# Altium footprint library MCU.PcbLib: 87 footprints (part 2 of 6)
Each footprint in its own frame and in the unit in brackets; x right, y up, seen from the top. Pads: shape width x height; smd on the part's side, far side on the other; paste and mask are expansions set on the pad; w line width, h text height; cw(c..) or ccw(c..) is an arc to the next point about the centre after c.
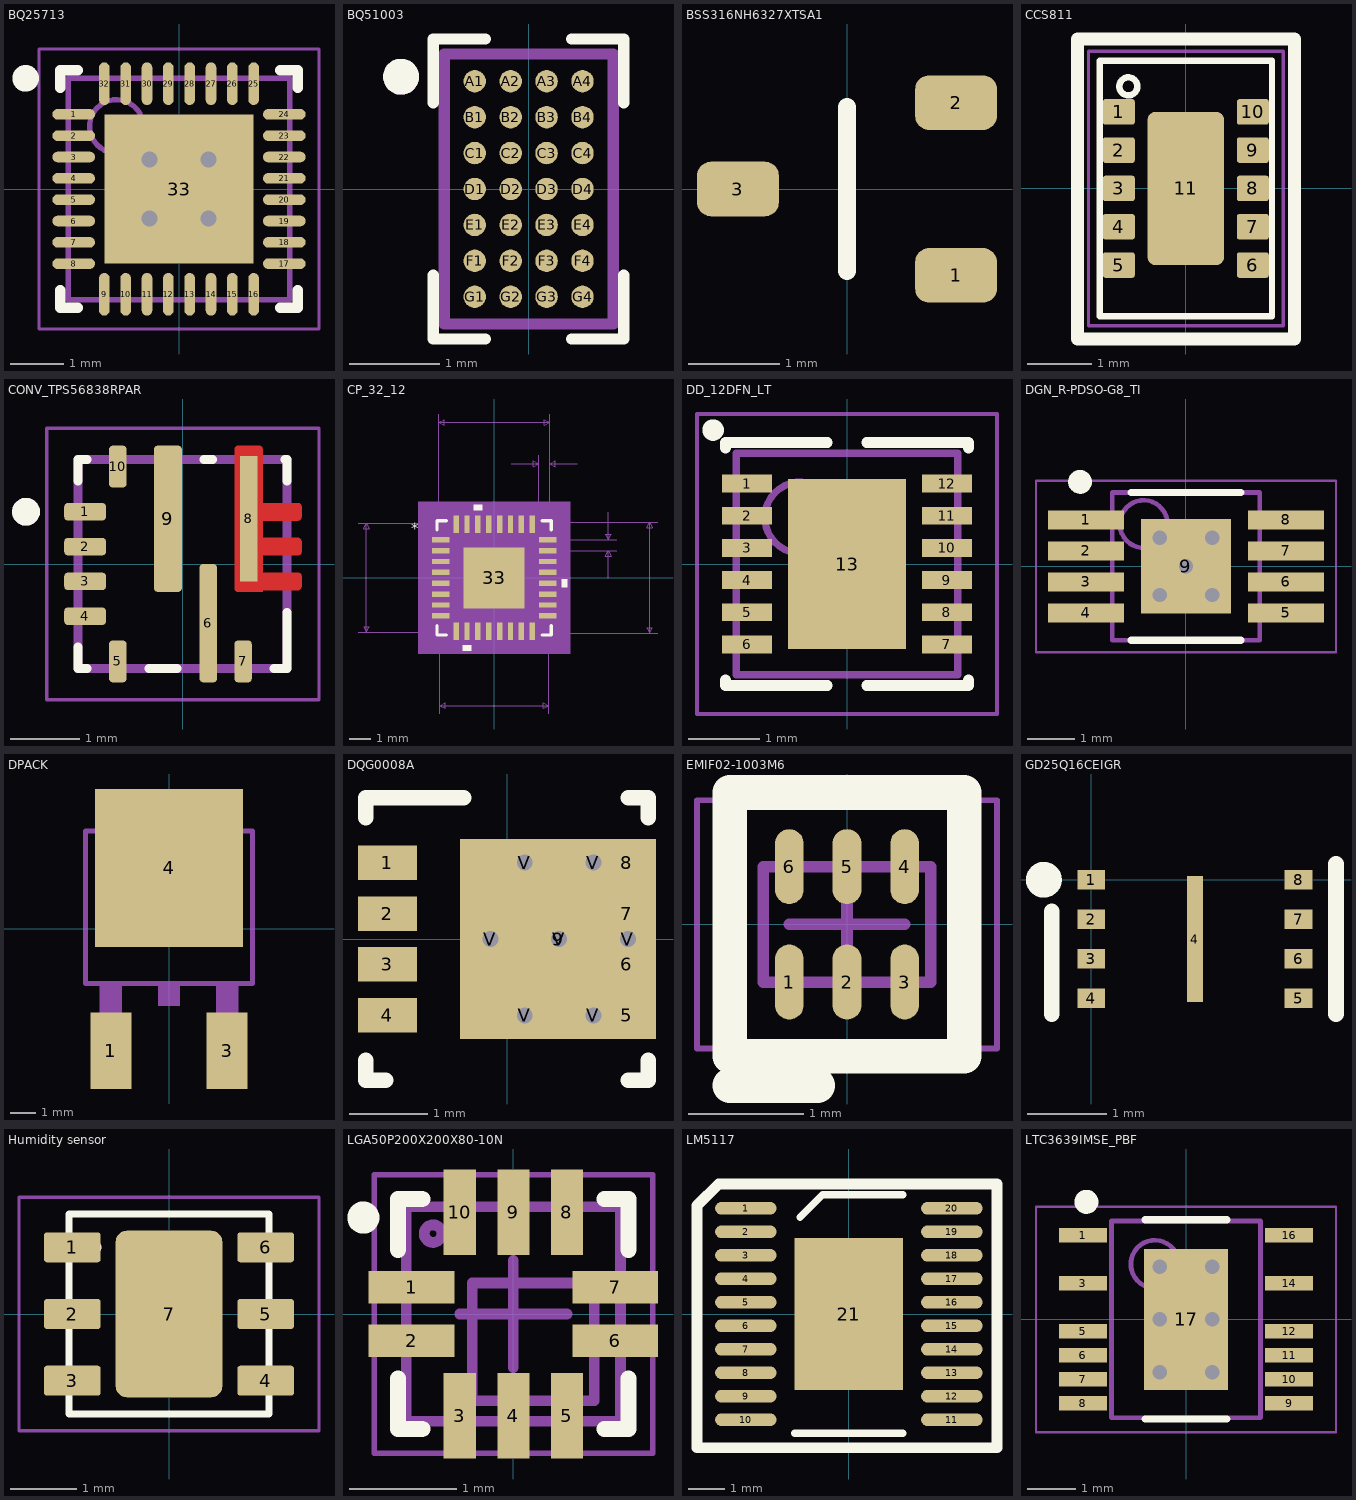
[diagram p1: the footprints below, top view; thin cyan lines are the x and y axes]

## BQ25713 [mm] "LI-ION battery charger USBC"
height 0.8
pads (33):
  oval 0.8x0.2 smd: 1(-1.975,1.4) 2(-1.975,1) 3(-1.975,0.6) 4(-1.975,0.2) 5(-1.975,-0.2) 6(-1.975,-0.6) 7(-1.975,-1) 8(-1.975,-1.4) 17(1.975,-1.4) 18(1.975,-1) 19(1.975,-0.6) 20(1.975,-0.2) 21(1.975,0.2) 22(1.975,0.6) 23(1.975,1) 24(1.975,1.4)
  oval 0.2x0.8 smd: 9(-1.4,-1.975) 10(-1,-1.975) 11(-0.6,-1.975) 12(-0.2,-1.975) 13(0.2,-1.975) 14(0.6,-1.975) 15(1,-1.975) 16(1.4,-1.975) 25(1.4,1.975) 26(1,1.975) 27(0.6,1.975) 28(0.2,1.975) 29(-0.2,1.975) 30(-0.6,1.975) 31(-1,1.975) 32(-1.4,1.975)
  rect 2.8x2.8 smd: 33(0,0)
via 0.55,-0.55 diameter 0.6 hole 0.3
via -0.55,-0.55 diameter 0.6 hole 0.3
via 0.55,0.55 diameter 0.6 hole 0.3
via -0.55,0.55 diameter 0.6 hole 0.3
Top Overlay:
  circle w0.25: c-2.875,2.075 r0.125
  lines w0.2: -2.225,-1.9 -2.225,-2.225 -1.9,-2.225 ; -2.225,1.9 -2.225,2.225 -1.9,2.225 ; 1.9,-2.225 2.225,-2.225 2.225,-1.9 ; 1.9,2.225 2.225,2.225 2.225,1.9
Mechanical 13:
  circle w0.1: c-1.175,1.175 r0.5
  lines w0.1: -2.075,-2.075 2.075,-2.075 2.075,2.075 -2.075,2.075 -2.075,-2.075
Mechanical 15:
  lines w0.05: -2.625,-2.625 2.625,-2.625 2.625,2.625 -2.625,2.625 -2.625,-2.625
  lines w0.1: -0.5,0 0.5,0 ; 0,-0.5 0,0.5
3D body: height 0.8, standoff 0.05, extent -2.075,-2.075 2.075,2.075

## BQ51003 [mm]
pads (28):
  round 0.25 smd: A1(-0.6,1.2) A2(-0.2,1.2) A3(0.2,1.2) A4(0.6,1.2) B1(-0.6,0.8) B2(-0.2,0.8) B3(0.2,0.8) B4(0.6,0.8) C1(-0.6,0.4) C2(-0.2,0.4) C3(0.2,0.4) C4(0.6,0.4) D1(-0.6,0) D2(-0.2,0) D3(0.2,0) D4(0.6,0) E1(-0.6,-0.4) E2(-0.2,-0.4) E3(0.2,-0.4) E4(0.6,-0.4) F1(-0.6,-0.8) F2(-0.2,-0.8) F3(0.2,-0.8) F4(0.6,-0.8) G1(-0.6,-1.2) G2(-0.2,-1.2) G3(0.2,-1.2) G4(0.6,-1.2)
Top Overlay:
  circle w0.2: c-1.419,1.25 r0.1
  lines w0.127: -1.06,-0.96 -1.06,-1.67 -0.48,-1.67 ; -1.06,0.96 -1.06,1.67 -0.48,1.67 ; 0.48,-1.67 1.06,-1.67 1.06,-0.96 ; 0.48,1.67 1.06,1.67 1.06,0.96
Mechanical 13:
  circle w0.2: c-1.419,1.25 r0.1
  lines w0.127: -0.941,-1.503 0.941,-1.503 0.941,1.503 -0.941,1.503 -0.941,-1.503
3D body "BQ51003YFPR--3DModel-STEP-56544.STEP": height 0.5, standoff 0, extent -0.941,-1.503 0.941,1.503

## BSS316NH6327XTSA1 [mm] "SOT23, 5-Leads, Body 2.95x2.80mm, Pitch 0.95mm, IPC High Density"
height 1.45
pads (3):
  rrect50% 0.9x0.6 smd: 1(1.2,-0.95) 2(1.2,0.95) 3(-1.2,0)
Top Overlay:
  lines w0.2: 0,-0.9 0,0.9
3D body "BSS670S2LH6327XTSA1.STEP": height 1.1, standoff 0, extent -1.25,-1.45 1.25,1.45

## CCS811 [mm]
height 1.1
pads (11):
  rrect20% 0.5x0.4 smd: 1(-1.05,1.2) 2(-1.05,0.6) 3(-1.05,0) 4(-1.05,-0.6) 5(-1.05,-1.2) 6(1.05,-1.2) 7(1.05,-0.6) 8(1.05,0) 9(1.05,0.6) 10(1.05,1.2)
  rrect20% 1.2x2.4 smd: 11(0,0)
Top Overlay:
  circle w0.1: c-0.9,1.6 r0.141
  lines w0.1: -1.35,-2 -1.35,2 0,2 1.35,2 1.35,-2 0,-2 -1.35,-2
  lines w0.2: -1.698,-2.359 1.702,-2.359 1.702,2.341 -1.698,2.341 -1.698,-2.359
Mechanical 15:
  lines w0.05: -0.25,0 0.25,0 ; 0,-0.25 0,0.25 ; -1.525,-2.15 1.525,-2.15 1.525,2.15 -1.525,2.15 -1.525,-2.15
3D body: height 1.1, standoff 0, extent -1.349,-1.999 1.349,1.999
3D body: height 1.11, standoff 0, extent -1.041,1.459 -0.759,1.741

## CONV_TPS56838RPAR [mm]
height 1
pads (10):
  rrect40% 0.6x0.25 smd paste-1 mask+0: 1(-1.4,0.75) 2(-1.4,0.25) 3(-1.4,-0.25) 4(-1.4,-0.75)
  rrect40% 0.25x0.6 smd paste-1 mask+0: 5(-0.93,-1.4) 7(0.87,-1.4) 10(-0.93,1.4)
  rrect40% 0.25x1.7 smd paste-2 mask+0: 6(0.37,-0.85)
  rect 0.25x1.8 smd paste-2 mask+0: 8(0.95,0.65)
  rrect25% 0.4x2.1 smd paste-2 mask+0: 9(-0.21,0.65)
Top Layer:
  region: 268 vertices and 0 holes, not listed, extent 0.75,-0.4 1.71,1.7
Top Overlay:
  circle w0.2: c-2.25,0.75 r0.1
  lines w0.127: -1.5,-1.195 -1.5,-1.5 -1.375,-1.5 ; -1.5,1.195 -1.5,1.5 -1.375,1.5 ; -0.485,-1.5 -0.075,-1.5 ; 0.31,1.5 0.43,1.5 ; 1.315,-1.5 1.5,-1.5 1.5,-0.695 ; 1.47,1.5 1.5,1.5 1.5,1.195
Top Paste:
  drawing of 12 lines, arcs and shapes, not listed
Top Solder:
  drawing of 10 lines, arcs and shapes, not listed
Mechanical 13:
  circle w0.2: c-2.25,0.75 r0.1
  lines w0.127: -1.5,-1.5 -1.5,1.5 1.5,1.5 1.5,-1.5 -1.5,-1.5
Mechanical 15:
  lines w0.05: -1.95,-1.95 1.961,-1.95 1.961,1.95 -1.95,1.95 -1.95,-1.95
3D body "step_temp.STEP": height 1, standoff 0, extent -1.5,-1.5 1.5,1.5

## CP_32_12 [mm]
pads (33):
  rect 0.805x0.25 smd paste+0 mask+0: 1(-2.452,1.75) 2(-2.452,1.25) 3(-2.452,0.75) 4(-2.452,0.25) 5(-2.452,-0.25) 6(-2.452,-0.75) 7(-2.452,-1.25) 8(-2.452,-1.75) 17(2.452,-1.75) 18(2.452,-1.25) 19(2.452,-0.75) 20(2.452,-0.25) 21(2.452,0.25) 22(2.452,0.75) 23(2.452,1.25) 24(2.452,1.75)
  rect 0.25x0.805 smd paste+0 mask+0: 9(-1.75,-2.452) 10(-1.25,-2.452) 11(-0.75,-2.452) 12(-0.25,-2.452) 13(0.25,-2.452) 14(0.75,-2.452) 15(1.25,-2.452) 16(1.75,-2.452) 25(1.75,2.452) 26(1.25,2.452) 27(0.75,2.452) 28(0.25,2.452) 29(-0.25,2.452) 30(-0.75,2.452) 31(-1.25,2.452) 32(-1.75,2.452)
  rect 2.8x2.8 smd paste-1.787 mask+0: 33(0,0)
Top Overlay:
  region: -0.56,3.109 -0.941,3.109 -0.941,3.363 -0.56,3.363
  region: 3.109,-0.059 3.363,-0.059 3.363,-0.44 3.109,-0.44
  region: -1.06,-3.109 -1.441,-3.109 -1.441,-3.363 -1.06,-3.363
  lines w0.152: -2.627,-2.208 -2.627,-2.627 -2.208,-2.627 ; -2.627,2.208 -2.627,2.627 -2.208,2.627 ; 2.208,-2.627 2.627,-2.627 2.627,-2.208 ; 2.208,2.627 2.627,2.627 2.627,2.208
  text "*" at -3.81,2.032 h0.51
Top Paste:
  region: 1.4,-0.1 0.1,-0.1 0.1,-1.4 1.4,-1.4
  region: 1.4,1.4 0.1,1.4 0.1,0.1 1.4,0.1
  region: -0.1,-0.1 -1.4,-0.1 -1.4,-1.4 -0.1,-1.4
  region: -0.1,1.4 -1.4,1.4 -1.4,0.1 -0.1,0.1
Mechanical 5:
  region: 3.49,-3.49 -3.49,-3.49 -3.49,3.49 3.49,3.49
Mechanical 7:
  lines w0.025: -6.258,-2.5 2.5,-2.5 ; -6.258,2.5 2.5,2.5 2.5,-6.258 ; -2.55,1.75 -2.55,7.528 ; -2.5,-6.258 -2.5,2.5 ; 0.78,5.242 2.05,5.242 ; 1.75,-2.55 7.528,-2.55 ; 1.75,2.55 7.528,2.55 ; 2.05,1.75 2.05,5.623 ; 2.452,1.25 5.623,1.25 ; 2.452,1.75 5.623,1.75 ; 2.55,5.623 2.55,1.75 2.55,7.528 ; 3.82,5.242 2.55,5.242 ; 5.242,-0.02 5.242,1.25 ; 5.242,3.02 5.242,1.75 ; -5.877,-2.5 -5.75,-2.246 -6.004,-2.246 -5.877,-2.5 ; -5.877,-2.5 -5.877,2.5 ; -5.877,2.5 -5.75,2.246 -6.004,2.246 -5.877,2.5 ; -2.55,7.147 -2.296,7.02 -2.296,7.274 -2.55,7.147 ; -2.55,7.147 2.55,7.147 ; -2.5,-5.877 -2.246,-6.004 -2.246,-5.75 -2.5,-5.877 ; -2.5,-5.877 2.5,-5.877 ; 2.05,5.242 1.796,5.115 1.796,5.369 2.05,5.242 ; 2.5,-5.877 2.246,-6.004 2.246,-5.75 2.5,-5.877 ; 2.55,5.242 2.804,5.115 2.804,5.369 2.55,5.242 ; 2.55,7.147 2.296,7.02 2.296,7.274 2.55,7.147 ; 5.242,1.25 5.369,0.996 5.115,0.996 5.242,1.25 ; 5.242,1.75 5.369,2.004 5.115,2.004 5.242,1.75 ; 7.147,-2.55 7.274,-2.296 7.02,-2.296 7.147,-2.55 ; 7.147,-2.55 7.147,2.55 ; 7.147,2.55 7.274,2.296 7.02,2.296 7.147,2.55
  text "0.197in/5mm" at -1.746,-7.02 h0.64
  text "0.197in/5mm" at -9.878,-0.318 h0.64
  text "0.201in/5.1mm" at 7.655,-0.318 h0.64
  text "0.201in/5.1mm" at -2.064,7.655 h0.64
  text "0.016in/0.4mm" at 0.236,5.75 h0.64
  text "0.02in/0.5mm" at 5.75,1.182 h0.64
  text "Alt 2 Padstyle: OX60Y90D30P" at -8.572,-16.825 h1.27
  text "Alt 1 Padstyle: OX90Y60D30P" at -8.572,-15.301 h1.27
  text "Heat Tab Padstyle: RX141p73Y141p73D0T" at -11.747,-12.253 h1.27
  text "Default Padstyle: RX31p69Y9p84D0T" at -10.477,-10.729 h1.27
Mechanical 13:
  lines w0.025: -2.5,1.23 -1.23,2.5 ; -2.55,-1.875 -2.5,-1.875 -2.5,-1.625 -2.55,-1.625 -2.55,-1.875 ; -2.55,-1.375 -2.5,-1.375 -2.5,-1.125 -2.55,-1.125 -2.55,-1.375 ; -2.55,-0.875 -2.5,-0.875 -2.5,-0.625 -2.55,-0.625 -2.55,-0.875 ; -2.55,-0.375 -2.5,-0.375 -2.5,-0.125 -2.55,-0.125 -2.55,-0.375 ; -2.55,0.125 -2.5,0.125 -2.5,0.375 -2.55,0.375 -2.55,0.125 ; -2.55,0.625 -2.5,0.625 -2.5,0.875 -2.55,0.875 -2.55,0.625 ; -2.55,1.125 -2.5,1.125 -2.5,1.375 -2.55,1.375 -2.55,1.125 ; -2.55,1.625 -2.5,1.625 -2.5,1.875 -2.55,1.875 -2.55,1.625 ; -2.5,-2.5 -2.5,2.5 2.5,2.5 2.5,-2.5 -2.5,-2.5 ; -1.875,-2.55 -1.625,-2.55 -1.625,-2.5 -1.875,-2.5 -1.875,-2.55 ; -1.875,2.5 -1.875,2.55 -1.625,2.55 -1.625,2.5 -1.875,2.5 ; -1.375,-2.55 -1.125,-2.55 -1.125,-2.5 -1.375,-2.5 -1.375,-2.55 ; -1.375,2.5 -1.375,2.55 -1.125,2.55 -1.125,2.5 -1.375,2.5 ; -0.875,-2.55 -0.625,-2.55 -0.625,-2.5 -0.875,-2.5 -0.875,-2.55 ; -0.875,2.5 -0.875,2.55 -0.625,2.55 -0.625,2.5 -0.875,2.5 ; -0.375,-2.55 -0.125,-2.55 -0.125,-2.5 -0.375,-2.5 -0.375,-2.55 ; -0.375,2.5 -0.375,2.55 -0.125,2.55 -0.125,2.5 -0.375,2.5 ; 0.125,-2.55 0.375,-2.55 0.375,-2.5 0.125,-2.5 0.125,-2.55 ; 0.125,2.5 0.125,2.55 0.375,2.55 0.375,2.5 0.125,2.5 ; 0.625,-2.55 0.875,-2.55 0.875,-2.5 0.625,-2.5 0.625,-2.55 ; 0.625,2.5 0.625,2.55 0.875,2.55 0.875,2.5 0.625,2.5 ; 1.125,-2.55 1.375,-2.55 1.375,-2.5 1.125,-2.5 1.125,-2.55 ; 1.125,2.5 1.125,2.55 1.375,2.55 1.375,2.5 1.125,2.5 ; 1.625,-2.55 1.875,-2.55 1.875,-2.5 1.625,-2.5 1.625,-2.55 ; 1.625,2.5 1.625,2.55 1.875,2.55 1.875,2.5 1.625,2.5 ; 2.5,-1.875 2.55,-1.875 2.55,-1.625 2.5,-1.625 2.5,-1.875 ; 2.5,-1.375 2.55,-1.375 2.55,-1.125 2.5,-1.125 2.5,-1.375 ; 2.5,-0.875 2.55,-0.875 2.55,-0.625 2.5,-0.625 2.5,-0.875 ; 2.5,-0.375 2.55,-0.375 2.55,-0.125 2.5,-0.125 2.5,-0.375 ; 2.5,0.125 2.55,0.125 2.55,0.375 2.5,0.375 2.5,0.125 ; 2.5,0.625 2.55,0.625 2.55,0.875 2.5,0.875 2.5,0.625 ; 2.5,1.125 2.55,1.125 2.55,1.375 2.5,1.375 2.5,1.125 ; 2.5,1.625 2.55,1.625 2.55,1.875 2.5,1.875 2.5,1.625
  text "*" at -2.368,1.365 h1.27
Mechanical 15:
  region: -1.896,-2.754 -2.65,-2.754 -2.65,-2 -2.9,-2 -2.9,2 -2.65,2 -2.65,2.754 -1.896,2.754 -1.896,3.004 2.104,3.004 2.104,2.754 2.858,2.754 2.858,2 3.108,2 3.108,-2 2.858,-2 2.858,-2.754 2.104,-2.754 2.104,-3.004 -1.896,-3.004
  lines w0.152: -3.004,-2 -3.004,2 -2.754,2 -2.754,2.754 -2,2.754 -2,3.004 2,3.004 2,2.754 2.754,2.754 2.754,2 3.004,2 3.004,-2 2.754,-2 2.754,-2.754 2,-2.754 2,-3.004 -2,-3.004 -2,-2.754 -2.754,-2.754 -2.754,-2 -3.004,-2
3D body: height 0.25, standoff 0, extent 0,0 0.254,0.254
3D body: height 0.51, standoff 0, extent -2.54,-2.54 2.54,2.54

## DD_12DFN_LT [mm]
pads (13):
  rect 0.7x0.25 smd: 1(-1.4,1.125) 2(-1.4,0.675) 3(-1.4,0.225) 4(-1.4,-0.225) 5(-1.4,-0.675) 6(-1.4,-1.125) 7(1.4,-1.125) 8(1.4,-0.675) 9(1.4,-0.225) 10(1.4,0.225) 11(1.4,0.675) 12(1.4,1.125)
  rect 1.65x2.38 smd: 13(0,0)
Top Overlay:
  circle w0.25: c-1.875,1.875 r0.025
  lines w0.15: -1.7,-1.625 -1.7,-1.7 -0.275,-1.7 ; -1.7,1.625 -1.7,1.7 -0.275,1.7 ; 0.275,-1.7 1.7,-1.7 1.7,-1.625 ; 0.275,1.7 1.7,1.7 1.7,1.625
Mechanical 15:
  lines w0.05: -2.1,-2.1 2.1,-2.1 2.1,2.1 -2.1,2.1 -2.1,-2.1
  lines w0.1: -0.5,0 0.5,0 ; 0,-0.5 0,0.5
Mechanical 17:
  circle w0.1: c-0.65,0.65 r0.5
  lines w0.1: -1.55,-1.55 1.55,-1.55 1.55,1.55 -1.55,1.55 -1.55,-1.55
  text ".Designator" at -1.25,-1.075 h0.8
3D body "DD_12DFN_LT.step": height 0.8, standoff 0, extent -1.551,-1.55 1.551,1.55

## DGN_R-PDSO-G8_TI [mm]
pads (9):
  rect 1.6x0.4 smd: 1(-2.1,0.975) 2(-2.1,0.325) 3(-2.1,-0.325) 4(-2.1,-0.975) 5(2.1,-0.975) 6(2.1,-0.325) 7(2.1,0.325) 8(2.1,0.975)
  rect 1.88x1.98 smd: 9(0,0)
via 0.55,0.6 diameter 0.65 hole 0.3
via -0.55,0.6 diameter 0.65 hole 0.3
via -0.55,-0.6 diameter 0.65 hole 0.3
via 0,0 diameter 0.65 hole 0.3
via 0.55,-0.6 diameter 0.65 hole 0.3
Top Overlay:
  circle w0.25: c-2.225,1.775 r0.125
  lines w0.15: -1.15,-1.55 1.15,-1.55 ; -1.15,1.55 1.15,1.55
Mechanical 15:
  lines w0.05: -3.15,-1.8 -3.15,1.8 3.15,1.8 3.15,-1.8 -3.15,-1.8
  lines w0.1: -0.5,0 0.5,0 ; 0,-0.5 0,0.5
Mechanical 17:
  circle w0.1: c-0.889,0.889 r0.5
  lines w0.1: -1.55,-1.55 -1.55,1.55 1.55,1.55 1.55,-1.55 -1.55,-1.55
  text ".Designator" at -1.27,-1.016 h0.8
3D body "MUY08A_ASM.stp": height 0.94, standoff -0.02, extent -2.451,-1.499 2.451,1.499

## DPACK [mm]
pads (3):
  rect 1.6x3 smd: 1(-2.28,-4.8) 3(2.28,-4.8)
  rect 5.8x6.2 smd: 4(0,2.38)
Mechanical 13:
  region: 2.565,4.648 2.565,3.937 -2.565,3.937 -2.565,4.648 -2.108,5.105 2.108,5.105
  region: 0.432,-3.023 -0.432,-3.023 -0.432,-2.261 0.432,-2.261
  region: 2.718,-5.156 1.854,-5.156 1.854,-2.261 2.718,-2.261
  region: -1.854,-5.156 -2.718,-5.156 -2.718,-2.261 -1.854,-2.261
  lines w0.203: 3.277,3.835 3.277,-2.159 -3.277,-2.159 -3.277,3.835 3.277,3.835 ; -2.565,3.937 2.565,3.937 2.565,4.648 2.108,5.105 -2.108,5.105 -2.565,4.648 -2.565,3.937
3D body "step_temp.STEP": height 2.56, standoff -0.04, extent -3.302,-5.969 3.302,4.064

## DQG0008A [mm]
pads (16):
  rect 0.75x0.44 smd paste-0.05 mask-0.051: 1(-1.525,0.975) 2(-1.525,0.325) 3(-1.525,-0.325) 4(-1.525,-0.975) 5(1.525,-0.975) 6(1.525,-0.325) 7(1.525,0.325) 8(1.525,0.975)
  rect 2.5x2.55 smd paste-1.262 mask-1.257: 9(0.65,0)
  round 0.5 / inner round 1.524 / far side round 0.5 hole 0.203 mask+0.051: V(-0.212,0) V(0.664,0) V(1.54,0)
  round 0.5 / inner round 1.524 / far side round 0.5 hole 0.203 mask-0.102: V(0.226,-0.975) V(0.226,0.975) V(1.102,-0.975) V(1.102,0.975)
Top Overlay:
  lines w0.2: -1.8,-1.55 -1.8,-1.8 -1.55,-1.8 ; -1.8,1.55 -1.8,1.8 -0.55,1.8 ; 1.55,-1.8 1.8,-1.8 1.8,-1.55 ; 1.55,1.8 1.8,1.8 1.8,1.55
Top Paste:
  region: 0.125,1.184 0.126,1.174 0.126,0.151 0.125,0.141 0.122,0.131 0.117,0.123 0.111,0.115 0.103,0.109 0.095,0.104 0.085,0.101 0.075,0.1 -0.499,0.1 -0.509,0.101 -0.519,0.104 -0.527,0.109 -0.535,0.115 -0.541,0.123 -0.546,0.131 -0.549,0.141 -0.55,0.151 -0.55,1.174 -0.549,1.184 -0.546,1.194 -0.541,1.202 -0.535,1.21 -0.527,1.216 -0.519,1.221 -0.509,1.224 -0.499,1.225 0.075,1.225 0.085,1.224 0.095,1.221 0.103,1.216 0.111,1.21 0.117,1.202 0.122,1.194
  region: 0.125,-0.141 0.126,-0.151 0.126,-1.174 0.125,-1.184 0.122,-1.194 0.117,-1.202 0.111,-1.21 0.103,-1.216 0.095,-1.221 0.085,-1.224 0.075,-1.225 -0.499,-1.225 -0.509,-1.224 -0.519,-1.221 -0.527,-1.216 -0.535,-1.21 -0.541,-1.202 -0.546,-1.194 -0.549,-1.184 -0.55,-1.174 -0.55,-0.151 -0.549,-0.141 -0.546,-0.131 -0.541,-0.123 -0.535,-0.115 -0.527,-0.109 -0.519,-0.104 -0.509,-0.101 -0.499,-0.1 0.075,-0.1 0.085,-0.101 0.095,-0.104 0.103,-0.109 0.111,-0.115 0.117,-0.123 0.122,-0.131
  region: 0.327,-1.184 0.326,-1.174 0.326,-0.151 0.327,-0.141 0.33,-0.131 0.335,-0.123 0.341,-0.115 0.349,-0.109 0.357,-0.104 0.367,-0.101 0.377,-0.1 0.951,-0.1 0.961,-0.101 0.971,-0.104 0.979,-0.109 0.987,-0.115 0.993,-0.123 0.998,-0.131 1.001,-0.141 1.002,-0.151 1.002,-1.174 1.001,-1.184 0.998,-1.194 0.993,-1.202 0.987,-1.21 0.979,-1.216 0.971,-1.221 0.961,-1.224 0.951,-1.225 0.377,-1.225 0.367,-1.224 0.357,-1.221 0.349,-1.216 0.341,-1.21 0.335,-1.202 0.33,-1.194
  region: 0.327,0.141 0.326,0.151 0.326,1.174 0.327,1.184 0.33,1.194 0.335,1.202 0.341,1.21 0.349,1.216 0.357,1.221 0.367,1.224 0.377,1.225 0.951,1.225 0.961,1.224 0.971,1.221 0.979,1.216 0.987,1.21 0.993,1.202 0.998,1.194 1.001,1.184 1.002,1.174 1.002,0.151 1.001,0.141 0.998,0.131 0.993,0.123 0.987,0.115 0.979,0.109 0.971,0.104 0.961,0.101 0.951,0.1 0.377,0.1 0.367,0.101 0.357,0.104 0.349,0.109 0.341,0.115 0.335,0.123 0.33,0.131
Top Solder:
  drawing of 5 lines, arcs and shapes, not listed
3D body "CSD19537Q3.STEP": height 1.1, standoff 0, extent -1.6,-1.65 1.7,1.65

## EMIF02-1003M6 [mm] "EMI filter and ESD protection"
height 0.55
pads (6):
  oval 0.25x0.65 smd: 1(-0.5,-0.5) 2(0,-0.5) 3(0.5,-0.5) 4(0.5,0.5) 5(0,0.5) 6(-0.5,0.5)
Top Overlay:
  lines w0.3: -1.016,-1.397 -0.254,-1.397 ; -1.016,-1.143 1.016,-1.143 1.016,1.143 -1.016,1.143 -1.016,-1.143
Mechanical 13:
  lines w0.1: -0.725,-0.5 0.725,-0.5 0.725,0.5 -0.725,0.5 -0.725,-0.5
Mechanical 15:
  lines w0.05: -1.3,-1.075 1.3,-1.075 1.3,1.075 -1.3,1.075 -1.3,-1.075
  lines w0.1: -0.5,0 0.5,0 ; 0,-0.5 0,0.5
3D body: height 0.55, standoff 0.02, extent -0.725,-0.5 0.725,0.5

## GD25Q16CEIGR [mm] "Flash SPI USON8 Package"
pads (9):
  rect 0.35x0.25 smd: 1(0,0) 2(0,-0.5) 3(0,-1) 4(0,-1.5) 5(2.625,-1.5) 6(2.625,-1) 7(2.625,-0.5) 8(2.625,0)
  rect 0.2x1.6 smd: 4(1.312,-0.75)
Top Overlay:
  circle w0.254: c-0.6,0 r0.1
  lines w0.2: -0.5,-1.7 -0.5,-0.4 ; 3.1,-1.7 3.1,0.2
3D body: height 0.45, standoff 0, extent -0.179,-1.737 2.821,0.263

## Humidity sensor [mm] "https://no.mouser.com/datasheet/2/368/Si7021-A20-1397917.pdf"
height 1.21
pads (7):
  rrect20% 0.85x0.45 smd: 1(-1.45,1) 2(-1.45,0) 3(-1.45,-1) 4(1.45,-1) 5(1.45,0) 6(1.45,1)
  rrect20% 1.6x2.5 smd: 7(0,0)
Top Overlay:
  circle w0.1: c-1.12,1 r0.055
  circle w0.1: c0,0 r0.375
  lines w0.1: -1.5,-1.5 1.5,-1.5 1.5,1.5 -1.5,1.5 -1.5,-1.5
Mechanical 15:
  lines w0.05: -0.508,0 0.508,0 ; 0,-0.508 0,0.508 ; -2.25,-1.75 -2.25,1.75 2.25,1.75 2.25,-1.75 -2.25,-1.75
3D body: height 1.22, standoff 0, extent -0.374,-0.374 0.374,0.374
3D body: height 1.21, standoff 0, extent -1.499,-1.499 1.499,1.499

## LGA50P200X200X80-10N [mm]
pads (10):
  rect 0.8x0.3 smd mask+0.05: 1(-0.95,0.25) 2(-0.95,-0.25) 6(0.95,-0.25) 7(0.95,0.25)
  rect 0.3x0.8 smd mask+0.05: 3(-0.5,-0.95) 4(0,-0.95) 5(0.5,-0.95) 8(0.5,0.95) 9(0,0.95) 10(-0.5,0.95)
Top Overlay:
  circle w0.2: c-1.4,0.9 r0.05
  lines w0.15: -1.075,-0.6 -1.075,-1.075 -0.85,-1.075 ; -1.075,0.6 -1.075,1.075 -0.85,1.075 ; 0.85,-1.075 1.075,-1.075 1.075,-0.6 ; 0.85,1.075 1.075,1.075 1.075,0.6
Mechanical 7:
  circle w0.1: c-0.75,0.75 r0.082
  lines w0.1: -1,-1 -1,1 1,1 1,-1 -1,-1 ; -0.385,-0.81 0.755,-0.81 0.755,0.29 -0.385,0.29 -0.385,-0.81
  text ".Designator" at -0.525,0.475 h0.38
Mechanical 15:
  lines w0.05: -1.3,-1.3 1.3,-1.3 1.3,1.3 -1.3,1.3 -1.3,-1.3
  lines w0.1: -0.5,0 0.5,0 ; 0,-0.5 0,0.5
3D body "PQFN50P200X200X80-10N.step": height 0.8, standoff 0, extent -1.05,-1.05 1.05,1.05

## LM5117 [mm]
pads (21):
  oval 1.7x0.35 smd: 1(-2.85,2.925) 2(-2.85,2.275) 3(-2.85,1.625) 4(-2.85,0.975) 5(-2.85,0.325) 6(-2.85,-0.325) 7(-2.85,-0.975) 8(-2.85,-1.625) 9(-2.85,-2.275) 10(-2.85,-2.925) 11(2.85,-2.925) 12(2.85,-2.275) 13(2.85,-1.625) 14(2.85,-0.975) 15(2.85,-0.325) 16(2.85,0.325) 17(2.85,0.975) 18(2.85,1.625) 19(2.85,2.275) 20(2.85,2.925)
  rect 3x4.2 smd: 21(0,0)
Top Overlay:
  lines w0.2: -1.5,-3.3 1.5,-3.3 ; -1.35,2.675 -0.725,3.3 1.5,3.3
  lines w0.3: -4.2,-3.7 4.1,-3.7 4.1,3.6 -3.6,3.6 -4.2,3 -4.2,-3.7
3D body "NOPB.STEP": height 1.1, standoff 0, extent -3.2,-3.25 3.2,3.25

## LTC3639IMSE_PBF [mm]
pads (13):
  rect 1x0.3 smd: 1(-2.15,1.75) 3(-2.15,0.75) 5(-2.15,-0.25) 6(-2.15,-0.75) 7(-2.15,-1.25) 8(-2.15,-1.75) 9(2.15,-1.75) 10(2.15,-1.25) 11(2.15,-0.75) 12(2.15,-0.25) 14(2.15,0.75) 16(2.15,1.75)
  rect 1.75x2.94 smd: 17(0,0)
via 0.55,-1.1 diameter 0.65 hole 0.3
via -0.55,1.1 diameter 0.65 hole 0.3
via 0.55,1.1 diameter 0.65 hole 0.3
via -0.55,0 diameter 0.65 hole 0.3
via 0.55,0 diameter 0.65 hole 0.3
via -0.55,-1.1 diameter 0.65 hole 0.3
Top Overlay:
  circle w0.25: c-2.075,2.45 r0.125
  lines w0.15: -0.85,-2.075 0.85,-2.075 ; -0.85,2.075 0.85,2.075
Mechanical 15:
  lines w0.05: -3.125,-2.35 -3.125,2.35 3.125,2.35 3.125,-2.35 -3.125,-2.35
  lines w0.1: -0.5,0 0.5,0 ; 0,-0.5 0,0.5
Mechanical 17:
  circle w0.1: c-0.65,1.15 r0.5
  lines w0.1: -1.55,-2.05 -1.55,2.05 1.55,2.05 1.55,-2.05 -1.55,-2.05
  text ".Designator" at -1.143,-1.016 h0.8
3D body: height 1.1, standoff 0.05, extent -1.55,-2.05 1.55,2.05